# Altium schematic symbol library jlcpcb_2025_04_capacitors_extended_0805.schlib: 3281 symbols (part 18 of 18) (continued)
## TMK212BBJ106KGHT
designator C?  Capacitance: 10uF  (hidden comment: *)
Capacitor, Ceramic (MLCC), 10uF, ±10%, 25V, X5R, ±10%, SMD 0805; Manufacturer: Taiyo Yuden; Manufacturer Part Number: TMK212BBJ106KGHT; Package Size: 0805; JLCPCB Basic Part: No; JLCPCB Part Number: C386084; Supplier 1: LCSC; Category: Capacitors - MLCC; Supplier Part Number 1: C386084; Tolerance: ±10%; Voltage Rating: 25V; Temperature Coefficient: X5R; RoHS: Yes; ComponentLink1Description: Datasheet; ComponentLink1URL: https://wmsc.lcsc.com/wmsc/upload/file/pdf/v2/lcsc/2304140030_Taiyo-Yuden-TMK212BBJ106KGHT_C386084.pdf; ComponentLink2Description: JLCPCB Part URL; ComponentLink2URL: https://jlcpcb.com/partdetail/C386084; ComponentLink3Description: LCSC Part URL; ComponentLink3URL: https://lcsc.com/product-detail/Multilayer-Ceramic-Capacitors-MLCC---SMD-SMT_Taiyo-Yuden-Taiyo-Yuden-TMK212BBJ106KGHT_C386084.html
footprint CAP-0805 (0805 (2012M) Capacitor)
pins: 1, 2

## TMK212BBJ106MG-T
designator C?  Capacitance: 10uF  (hidden comment: *)
Capacitor, Ceramic (MLCC), 10uF, ±20%, 25V, X5R, ±20%, SMD 0805; Manufacturer: Taiyo Yuden; Manufacturer Part Number: TMK212BBJ106MG-T; Package Size: 0805; JLCPCB Basic Part: No; JLCPCB Part Number: C92606; Supplier 1: LCSC; Category: Capacitors - MLCC; Supplier Part Number 1: C92606; Tolerance: ±20%; Voltage Rating: 25V; Temperature Coefficient: X5R; RoHS: Yes; ComponentLink1Description: Datasheet; ComponentLink1URL: https://wmsc.lcsc.com/wmsc/upload/file/pdf/v2/lcsc/1810091433_Taiyo-Yuden-TMK212BBJ106MG-T_C92606.pdf; ComponentLink2Description: JLCPCB Part URL; ComponentLink2URL: https://jlcpcb.com/partdetail/C92606; ComponentLink3Description: LCSC Part URL; ComponentLink3URL: https://lcsc.com/product-detail/Multilayer-Ceramic-Capacitors-MLCC---SMD-SMT_Taiyo-Yuden-Taiyo-Yuden-TMK212BBJ106MG-T_C92606.html
footprint CAP-0805 (0805 (2012M) Capacitor)
pins: 1, 2

## TMK212BBJ226MG-TT
designator C?  Capacitance: 22uF  (hidden comment: *)
Capacitor, Ceramic (MLCC), 22uF, ±20%, 25V, X5R, ±20%, SMD 0805; Manufacturer: Taiyo Yuden; Manufacturer Part Number: TMK212BBJ226MG-TT; Package Size: 0805; JLCPCB Basic Part: No; JLCPCB Part Number: C2686248; Supplier 1: LCSC; Category: Capacitors - MLCC; Supplier Part Number 1: C2686248; Tolerance: ±20%; Voltage Rating: 25V; Temperature Coefficient: X5R; RoHS: Yes; ComponentLink1Description: Datasheet; ComponentLink1URL: https://wmsc.lcsc.com/wmsc/upload/file/pdf/v2/lcsc/2106070205_Taiyo-Yuden-TMK212BBJ226MG-TT_C2686248.pdf; ComponentLink2Description: JLCPCB Part URL; ComponentLink2URL: https://jlcpcb.com/partdetail/C2686248; ComponentLink3Description: LCSC Part URL; ComponentLink3URL: https://lcsc.com/product-detail/Multilayer-Ceramic-Capacitors-MLCC---SMD-SMT_Taiyo-Yuden-Taiyo-Yuden-TMK212BBJ226MG-TT_C2686248.html
footprint CAP-0805 (0805 (2012M) Capacitor)
pins: 1, 2

## TMK212BBJ475KGHT
designator C?  Capacitance: 4.7uF  (hidden comment: *)
Capacitor, Ceramic (MLCC), 4.7uF, ±10%, 25V, X5R, ±10%, SMD 0805; Manufacturer: Taiyo Yuden; Manufacturer Part Number: TMK212BBJ475KGHT; Package Size: 0805; JLCPCB Basic Part: No; JLCPCB Part Number: C386086; Supplier 1: LCSC; Category: Capacitors - MLCC; Supplier Part Number 1: C386086; Tolerance: ±10%; Voltage Rating: 25V; Temperature Coefficient: X5R; RoHS: Yes; ComponentLink1Description: Datasheet; ComponentLink1URL: https://wmsc.lcsc.com/wmsc/upload/file/pdf/v2/lcsc/2211282230_Taiyo-Yuden-TMK212BBJ475KGHT_C386086.pdf; ComponentLink2Description: JLCPCB Part URL; ComponentLink2URL: https://jlcpcb.com/partdetail/C386086; ComponentLink3Description: LCSC Part URL; ComponentLink3URL: https://lcsc.com/product-detail/Multilayer-Ceramic-Capacitors-MLCC---SMD-SMT_Taiyo-Yuden-Taiyo-Yuden-TMK212BBJ475KGHT_C386086.html
footprint CAP-0805 (0805 (2012M) Capacitor)
pins: 1, 2

## TMK212BBJ475MD-T
designator C?  Capacitance: 4.7uF  (hidden comment: *)
Capacitor, Ceramic (MLCC), 4.7uF, ±20%, 25V, X5R, ±20%, SMD 0805; Manufacturer: Taiyo Yuden; Manufacturer Part Number: TMK212BBJ475MD-T; Package Size: 0805; JLCPCB Basic Part: No; JLCPCB Part Number: C650989; Supplier 1: LCSC; Category: Capacitors - MLCC; Supplier Part Number 1: C650989; Tolerance: ±20%; Voltage Rating: 25V; Temperature Coefficient: X5R; RoHS: Yes; ComponentLink1Description: Datasheet; ComponentLink1URL: https://wmsc.lcsc.com/wmsc/upload/file/pdf/v2/lcsc/2211282200_Taiyo-Yuden-TMK212BBJ475MD-T_C650989.pdf; ComponentLink2Description: JLCPCB Part URL; ComponentLink2URL: https://jlcpcb.com/partdetail/C650989; ComponentLink3Description: LCSC Part URL; ComponentLink3URL: https://lcsc.com/product-detail/Multilayer-Ceramic-Capacitors-MLCC---SMD-SMT_Taiyo-Yuden-Taiyo-Yuden-TMK212BBJ475MD-T_C650989.html
footprint CAP-0805 (0805 (2012M) Capacitor)
pins: 1, 2

## TMK212BJ105KD-T
designator C?  Capacitance: 1uF  (hidden comment: *)
Capacitor, Ceramic (MLCC), 1uF, ±10%, 25V, X5R, ±10%, SMD 0805; Manufacturer: Taiyo Yuden; Manufacturer Part Number: TMK212BJ105KD-T; Package Size: 0805; JLCPCB Basic Part: No; JLCPCB Part Number: C2174205; Supplier 1: LCSC; Category: Capacitors - MLCC; Supplier Part Number 1: C2174205; Tolerance: ±10%; Voltage Rating: 25V; Temperature Coefficient: X5R; RoHS: Yes; ComponentLink1Description: Datasheet; ComponentLink1URL: https://wmsc.lcsc.com/wmsc/upload/file/pdf/v2/lcsc/2211282000_Taiyo-Yuden-TMK212BJ105KD-T_C2174205.pdf; ComponentLink2Description: JLCPCB Part URL; ComponentLink2URL: https://jlcpcb.com/partdetail/C2174205; ComponentLink3Description: LCSC Part URL; ComponentLink3URL: https://lcsc.com/product-detail/Multilayer-Ceramic-Capacitors-MLCC---SMD-SMT_Taiyo-Yuden-Taiyo-Yuden-TMK212BJ105KD-T_C2174205.html
footprint CAP-0805 (0805 (2012M) Capacitor)
pins: 1, 2

## TMK212BJ105KG-T
designator C?  Capacitance: 1uF  (hidden comment: *)
Capacitor, Ceramic (MLCC), 1uF, ±10%, 25V, X5R, ±10%, SMD 0805; Manufacturer: Taiyo Yuden; Manufacturer Part Number: TMK212BJ105KG-T; Package Size: 0805; JLCPCB Basic Part: No; JLCPCB Part Number: C92829; Supplier 1: LCSC; Category: Capacitors - MLCC; Supplier Part Number 1: C92829; Tolerance: ±10%; Voltage Rating: 25V; Temperature Coefficient: X5R; RoHS: Yes; ComponentLink1Description: Datasheet; ComponentLink1URL: https://wmsc.lcsc.com/wmsc/upload/file/pdf/v2/lcsc/2211282300_Taiyo-Yuden-TMK212BJ105KG-T_C92829.pdf; ComponentLink2Description: JLCPCB Part URL; ComponentLink2URL: https://jlcpcb.com/partdetail/C92829; ComponentLink3Description: LCSC Part URL; ComponentLink3URL: https://lcsc.com/product-detail/Multilayer-Ceramic-Capacitors-MLCC---SMD-SMT_Taiyo-Yuden-Taiyo-Yuden-TMK212BJ105KG-T_C92829.html
footprint CAP-0805 (0805 (2012M) Capacitor)
pins: 1, 2

## TMK212BJ106KG-TD
designator C?  Capacitance: 10uF  (hidden comment: *)
Capacitor, Ceramic (MLCC), 10uF, ±10%, 25V, ±10%, SMD 0805; Manufacturer: Taiyo Yuden; Manufacturer Part Number: TMK212BJ106KG-TD; Package Size: 0805; JLCPCB Basic Part: No; JLCPCB Part Number: C386087; Supplier 1: LCSC; Category: Capacitors - MLCC; Supplier Part Number 1: C386087; Tolerance: ±10%; Voltage Rating: 25V; RoHS: Yes; ComponentLink1Description: Datasheet; ComponentLink1URL: https://wmsc.lcsc.com/wmsc/upload/file/pdf/v2/lcsc/2304140030_Taiyo-Yuden-TMK212BJ106KG-TD_C386087.pdf; ComponentLink2Description: JLCPCB Part URL; ComponentLink2URL: https://jlcpcb.com/partdetail/C386087; ComponentLink3Description: LCSC Part URL; ComponentLink3URL: https://lcsc.com/product-detail/Multilayer-Ceramic-Capacitors-MLCC---SMD-SMT_Taiyo-Yuden-Taiyo-Yuden-TMK212BJ106KG-TD_C386087.html
footprint CAP-0805 (0805 (2012M) Capacitor)
pins: 1, 2

## TMK212BJ225KG-T
designator C?  Capacitance: 2.2uF  (hidden comment: *)
Capacitor, Ceramic (MLCC), 2.2uF, ±10%, 25V, X5R, ±10%, SMD 0805; Manufacturer: Taiyo Yuden; Manufacturer Part Number: TMK212BJ225KG-T; Package Size: 0805; JLCPCB Basic Part: No; JLCPCB Part Number: C92830; Supplier 1: LCSC; Category: Capacitors - MLCC; Supplier Part Number 1: C92830; Tolerance: ±10%; Voltage Rating: 25V; Temperature Coefficient: X5R; RoHS: Yes; ComponentLink1Description: Datasheet; ComponentLink1URL: https://wmsc.lcsc.com/wmsc/upload/file/pdf/v2/lcsc/1810182213_Taiyo-Yuden-TMK212BJ225KG-T_C92830.pdf; ComponentLink2Description: JLCPCB Part URL; ComponentLink2URL: https://jlcpcb.com/partdetail/C92830; ComponentLink3Description: LCSC Part URL; ComponentLink3URL: https://lcsc.com/product-detail/Multilayer-Ceramic-Capacitors-MLCC---SMD-SMT_Taiyo-Yuden-Taiyo-Yuden-TMK212BJ225KG-T_C92830.html
footprint CAP-0805 (0805 (2012M) Capacitor)
pins: 1, 2

## TMK212BJ474KD-T
designator C?  Capacitance: 470nF  (hidden comment: *)
Capacitor, Ceramic (MLCC), 470nF, ±10%, 25V, X5R, ±10%, SMD 0805; Manufacturer: Taiyo Yuden; Manufacturer Part Number: TMK212BJ474KD-T; Package Size: 0805; JLCPCB Basic Part: No; JLCPCB Part Number: C386088; Supplier 1: LCSC; Category: Capacitors - MLCC; Supplier Part Number 1: C386088; Tolerance: ±10%; Voltage Rating: 25V; Temperature Coefficient: X5R; RoHS: Yes; ComponentLink1Description: Datasheet; ComponentLink1URL: https://wmsc.lcsc.com/wmsc/upload/file/pdf/v2/lcsc/2211282230_Taiyo-Yuden-TMK212BJ474KD-T_C386088.pdf; ComponentLink2Description: JLCPCB Part URL; ComponentLink2URL: https://jlcpcb.com/partdetail/C386088; ComponentLink3Description: LCSC Part URL; ComponentLink3URL: https://lcsc.com/product-detail/Multilayer-Ceramic-Capacitors-MLCC---SMD-SMT_Taiyo-Yuden-Taiyo-Yuden-TMK212BJ474KD-T_C386088.html
footprint CAP-0805 (0805 (2012M) Capacitor)
pins: 1, 2

## TMK212BJ475KG-T
designator C?  Capacitance: 4.7uF  (hidden comment: *)
Capacitor, Ceramic (MLCC), 4.7uF, ±10%, 25V, X5R, ±10%, SMD 0805; Manufacturer: Taiyo Yuden; Manufacturer Part Number: TMK212BJ475KG-T; Package Size: 0805; JLCPCB Basic Part: No; JLCPCB Part Number: C319192; Supplier 1: LCSC; Category: Capacitors - MLCC; Supplier Part Number 1: C319192; Tolerance: ±10%; Voltage Rating: 25V; Temperature Coefficient: X5R; RoHS: Yes; ComponentLink1Description: Datasheet; ComponentLink1URL: https://wmsc.lcsc.com/wmsc/upload/file/pdf/v2/lcsc/2304140030_Taiyo-Yuden-TMK212BJ475KG-T_C319192.pdf; ComponentLink2Description: JLCPCB Part URL; ComponentLink2URL: https://jlcpcb.com/partdetail/C319192; ComponentLink3Description: LCSC Part URL; ComponentLink3URL: https://lcsc.com/product-detail/Multilayer-Ceramic-Capacitors-MLCC---SMD-SMT_Taiyo-Yuden-Taiyo-Yuden-TMK212BJ475KG-T_C319192.html
footprint CAP-0805 (0805 (2012M) Capacitor)
pins: 1, 2

## TT21X475K160CT
designator C?  Capacitance: 4.7uF  (hidden comment: *)
Capacitor, Ceramic (MLCC), 4.7uF, ±10%, 16V, X5R, ±10%, SMD 0805; Manufacturer: Walsin Tech Corp; Manufacturer Part Number: TT21X475K160CT; Package Size: 0805; JLCPCB Basic Part: No; JLCPCB Part Number: C384657; Supplier 1: LCSC; Category: Capacitors - MLCC; Supplier Part Number 1: C384657; Tolerance: ±10%; Voltage Rating: 16V; Temperature Coefficient: X5R; RoHS: Yes; ComponentLink1Description: Datasheet; ComponentLink1URL: https://wmsc.lcsc.com/wmsc/upload/file/pdf/v2/lcsc/1912111437_Walsin-Tech-Corp-TT21X475K160CT_C384657.pdf; ComponentLink2Description: JLCPCB Part URL; ComponentLink2URL: https://jlcpcb.com/partdetail/C384657; ComponentLink3Description: LCSC Part URL; ComponentLink3URL: https://lcsc.com/product-detail/Multilayer-Ceramic-Capacitors-MLCC---SMD-SMT_Walsin-Tech-Corp-Walsin-Tech-Corp-TT21X475K160CT_C384657.html
footprint CAP-0805 (0805 (2012M) Capacitor)
pins: 1, 2

## UMF212B7105KGHT
designator C?  Capacitance: 1uF  (hidden comment: *)
Capacitor, Ceramic (MLCC), 1uF, ±10%, 50V, ±10%, SMD 0805; Manufacturer: Taiyo Yuden; Manufacturer Part Number: UMF212B7105KGHT; Package Size: 0805; JLCPCB Basic Part: No; JLCPCB Part Number: C386107; Supplier 1: LCSC; Category: Capacitors - MLCC; Supplier Part Number 1: C386107; Tolerance: ±10%; Voltage Rating: 50V; RoHS: Yes; ComponentLink1Description: Datasheet; ComponentLink1URL: https://wmsc.lcsc.com/wmsc/upload/file/pdf/v2/lcsc/2010231635_Taiyo-Yuden-UMF212B7105KGHT_C386107.pdf; ComponentLink2Description: JLCPCB Part URL; ComponentLink2URL: https://jlcpcb.com/partdetail/C386107; ComponentLink3Description: LCSC Part URL; ComponentLink3URL: https://lcsc.com/product-detail/Multilayer-Ceramic-Capacitors-MLCC---SMD-SMT_Taiyo-Yuden-Taiyo-Yuden-UMF212B7105KGHT_C386107.html
footprint CAP-0805 (0805 (2012M) Capacitor)
pins: 1, 2

## UMF212B7224KGHT
designator C?  Capacitance: 220nF  (hidden comment: *)
Capacitor, Ceramic (MLCC), 220nF, ±10%, 50V, X7R, ±10%, SMD 0805; Manufacturer: Taiyo Yuden; Manufacturer Part Number: UMF212B7224KGHT; Package Size: 0805; JLCPCB Basic Part: No; JLCPCB Part Number: C651009; Supplier 1: LCSC; Category: Capacitors - MLCC; Supplier Part Number 1: C651009; Tolerance: ±10%; Voltage Rating: 50V; Temperature Coefficient: X7R; RoHS: Yes; ComponentLink1Description: Datasheet; ComponentLink1URL: https://wmsc.lcsc.com/wmsc/upload/file/pdf/v2/lcsc/2304140030_Taiyo-Yuden-UMF212B7224KGHT_C651009.pdf; ComponentLink2Description: JLCPCB Part URL; ComponentLink2URL: https://jlcpcb.com/partdetail/C651009; ComponentLink3Description: LCSC Part URL; ComponentLink3URL: https://lcsc.com/product-detail/Multilayer-Ceramic-Capacitors-MLCC---SMD-SMT_Taiyo-Yuden-Taiyo-Yuden-UMF212B7224KGHT_C651009.html
footprint CAP-0805 (0805 (2012M) Capacitor)
pins: 1, 2

## UMJ212BB7103KGHT
designator C?  Capacitance: 10nF  (hidden comment: *)
Capacitor, Ceramic (MLCC), 10nF, ±10%, 50V, X7R, ±10%, SMD 0805; Manufacturer: Taiyo Yuden; Manufacturer Part Number: UMJ212BB7103KGHT; Package Size: 0805; JLCPCB Basic Part: No; JLCPCB Part Number: C651019; Supplier 1: LCSC; Category: Capacitors - MLCC; Supplier Part Number 1: C651019; Tolerance: ±10%; Voltage Rating: 50V; Temperature Coefficient: X7R; RoHS: Yes; ComponentLink1Description: Datasheet; ComponentLink1URL: https://wmsc.lcsc.com/wmsc/upload/file/pdf/v2/lcsc/2304140030_Taiyo-Yuden-UMJ212BB7103KGHT_C651019.pdf; ComponentLink2Description: JLCPCB Part URL; ComponentLink2URL: https://jlcpcb.com/partdetail/C651019; ComponentLink3Description: LCSC Part URL; ComponentLink3URL: https://lcsc.com/product-detail/Multilayer-Ceramic-Capacitors-MLCC---SMD-SMT_Taiyo-Yuden-Taiyo-Yuden-UMJ212BB7103KGHT_C651019.html
footprint CAP-0805 (0805 (2012M) Capacitor)
pins: 1, 2

## UMJ212BB7104KGHT
designator C?  Capacitance: 100nF  (hidden comment: *)
Capacitor, Ceramic (MLCC), 100nF, ±10%, 50V, X7R, ±10%, SMD 0805; Manufacturer: Taiyo Yuden; Manufacturer Part Number: UMJ212BB7104KGHT; Package Size: 0805; JLCPCB Basic Part: No; JLCPCB Part Number: C651000; Supplier 1: LCSC; Category: Capacitors - MLCC; Supplier Part Number 1: C651000; Tolerance: ±10%; Voltage Rating: 50V; Temperature Coefficient: X7R; RoHS: Yes; ComponentLink1Description: Datasheet; ComponentLink1URL: https://wmsc.lcsc.com/wmsc/upload/file/pdf/v2/lcsc/2304140030_Taiyo-Yuden-UMJ212BB7104KGHT_C651000.pdf; ComponentLink2Description: JLCPCB Part URL; ComponentLink2URL: https://jlcpcb.com/partdetail/C651000; ComponentLink3Description: LCSC Part URL; ComponentLink3URL: https://lcsc.com/product-detail/Multilayer-Ceramic-Capacitors-MLCC---SMD-SMT_Taiyo-Yuden-Taiyo-Yuden-UMJ212BB7104KGHT_C651000.html
footprint CAP-0805 (0805 (2012M) Capacitor)
pins: 1, 2

## UMJ212BB7223KGHT
designator C?  Capacitance: 22nF  (hidden comment: *)
Capacitor, Ceramic (MLCC), 22nF, ±10%, 50V, X7R, ±10%, SMD 0805; Manufacturer: Taiyo Yuden; Manufacturer Part Number: UMJ212BB7223KGHT; Package Size: 0805; JLCPCB Basic Part: No; JLCPCB Part Number: C651014; Supplier 1: LCSC; Category: Capacitors - MLCC; Supplier Part Number 1: C651014; Tolerance: ±10%; Voltage Rating: 50V; Temperature Coefficient: X7R; RoHS: Yes; ComponentLink1Description: Datasheet; ComponentLink1URL: https://wmsc.lcsc.com/wmsc/upload/file/pdf/v2/lcsc/2304140030_Taiyo-Yuden-UMJ212BB7223KGHT_C651014.pdf; ComponentLink2Description: JLCPCB Part URL; ComponentLink2URL: https://jlcpcb.com/partdetail/C651014; ComponentLink3Description: LCSC Part URL; ComponentLink3URL: https://lcsc.com/product-detail/Multilayer-Ceramic-Capacitors-MLCC---SMD-SMT_Taiyo-Yuden-Taiyo-Yuden-UMJ212BB7223KGHT_C651014.html
footprint CAP-0805 (0805 (2012M) Capacitor)
pins: 1, 2

## UMJ212BB7473KGHT
designator C?  Capacitance: 47nF  (hidden comment: *)
Capacitor, Ceramic (MLCC), 47nF, ±10%, 50V, X7R, ±10%, SMD 0805; Manufacturer: Taiyo Yuden; Manufacturer Part Number: UMJ212BB7473KGHT; Package Size: 0805; JLCPCB Basic Part: No; JLCPCB Part Number: C651020; Supplier 1: LCSC; Category: Capacitors - MLCC; Supplier Part Number 1: C651020; Tolerance: ±10%; Voltage Rating: 50V; Temperature Coefficient: X7R; RoHS: Yes; ComponentLink1Description: Datasheet; ComponentLink1URL: https://wmsc.lcsc.com/wmsc/upload/file/pdf/v2/lcsc/2304140030_Taiyo-Yuden-UMJ212BB7473KGHT_C651020.pdf; ComponentLink2Description: JLCPCB Part URL; ComponentLink2URL: https://jlcpcb.com/partdetail/C651020; ComponentLink3Description: LCSC Part URL; ComponentLink3URL: https://lcsc.com/product-detail/Multilayer-Ceramic-Capacitors-MLCC---SMD-SMT_Taiyo-Yuden-Taiyo-Yuden-UMJ212BB7473KGHT_C651020.html
footprint CAP-0805 (0805 (2012M) Capacitor)
pins: 1, 2

## UMJ212CB7105KGHT
designator C?  Capacitance: 1uF  (hidden comment: *)
Capacitor, Ceramic (MLCC), 1uF, ±10%, 50V, X7R, ±10%, SMD 0805; Manufacturer: Taiyo Yuden; Manufacturer Part Number: UMJ212CB7105KGHT; Package Size: 0805; JLCPCB Basic Part: No; JLCPCB Part Number: C2181287; Supplier 1: LCSC; Category: Capacitors - MLCC; Supplier Part Number 1: C2181287; Tolerance: ±10%; Voltage Rating: 50V; Temperature Coefficient: X7R; RoHS: Yes; ComponentLink1Description: Datasheet; ComponentLink1URL: https://wmsc.lcsc.com/wmsc/upload/file/pdf/v2/lcsc/2211282000_Taiyo-Yuden-UMJ212CB7105KGHT_C2181287.pdf; ComponentLink2Description: JLCPCB Part URL; ComponentLink2URL: https://jlcpcb.com/partdetail/C2181287; ComponentLink3Description: LCSC Part URL; ComponentLink3URL: https://lcsc.com/product-detail/Multilayer-Ceramic-Capacitors-MLCC---SMD-SMT_Taiyo-Yuden-Taiyo-Yuden-UMJ212CB7105KGHT_C2181287.html
footprint CAP-0805 (0805 (2012M) Capacitor)
pins: 1, 2

## UMK212ABJ225KG-T
designator C?  Capacitance: 2.2uF  (hidden comment: *)
Capacitor, Ceramic (MLCC), 2.2uF, ±10%, 50V, X5R, ±10%, SMD 0805; Manufacturer: Taiyo Yuden; Manufacturer Part Number: UMK212ABJ225KG-T; Package Size: 0805; JLCPCB Basic Part: No; JLCPCB Part Number: C337444; Supplier 1: LCSC; Category: Capacitors - MLCC; Supplier Part Number 1: C337444; Tolerance: ±10%; Voltage Rating: 50V; Temperature Coefficient: X5R; RoHS: Yes; ComponentLink1Description: Datasheet; ComponentLink1URL: https://wmsc.lcsc.com/wmsc/upload/file/pdf/v2/lcsc/2211282230_Taiyo-Yuden-UMK212ABJ225KG-T_C337444.pdf; ComponentLink2Description: JLCPCB Part URL; ComponentLink2URL: https://jlcpcb.com/partdetail/C337444; ComponentLink3Description: LCSC Part URL; ComponentLink3URL: https://lcsc.com/product-detail/Multilayer-Ceramic-Capacitors-MLCC---SMD-SMT_Taiyo-Yuden-Taiyo-Yuden-UMK212ABJ225KG-T_C337444.html
footprint CAP-0805 (0805 (2012M) Capacitor)
pins: 1, 2

## UMK212B7103KGHT
designator C?  Capacitance: 10nF  (hidden comment: *)
Capacitor, Ceramic (MLCC), 10nF, ±10%, 50V, X7R, ±10%, SMD 0805; Manufacturer: Taiyo Yuden; Manufacturer Part Number: UMK212B7103KGHT; Package Size: 0805; JLCPCB Basic Part: No; JLCPCB Part Number: C650940; Supplier 1: LCSC; Category: Capacitors - MLCC; Supplier Part Number 1: C650940; Tolerance: ±10%; Voltage Rating: 50V; Temperature Coefficient: X7R; RoHS: Yes; ComponentLink1Description: Datasheet; ComponentLink1URL: https://wmsc.lcsc.com/wmsc/upload/file/pdf/v2/lcsc/2304140030_Taiyo-Yuden-UMK212B7103KGHT_C650940.pdf; ComponentLink2Description: JLCPCB Part URL; ComponentLink2URL: https://jlcpcb.com/partdetail/C650940; ComponentLink3Description: LCSC Part URL; ComponentLink3URL: https://lcsc.com/product-detail/Multilayer-Ceramic-Capacitors-MLCC---SMD-SMT_Taiyo-Yuden-Taiyo-Yuden-UMK212B7103KGHT_C650940.html
footprint CAP-0805 (0805 (2012M) Capacitor)
pins: 1, 2

## UMK212B7104KGHT
designator C?  Capacitance: 100nF  (hidden comment: *)
Capacitor, Ceramic (MLCC), 100nF, ±10%, 50V, X7R, ±10%, SMD 0805; Manufacturer: Taiyo Yuden; Manufacturer Part Number: UMK212B7104KGHT; Package Size: 0805; JLCPCB Basic Part: No; JLCPCB Part Number: C268015; Supplier 1: LCSC; Category: Capacitors - MLCC; Supplier Part Number 1: C268015; Tolerance: ±10%; Voltage Rating: 50V; Temperature Coefficient: X7R; RoHS: Yes; ComponentLink1Description: Datasheet; ComponentLink1URL: https://wmsc.lcsc.com/wmsc/upload/file/pdf/v2/lcsc/2211282230_Taiyo-Yuden-UMK212B7104KGHT_C268015.pdf; ComponentLink2Description: JLCPCB Part URL; ComponentLink2URL: https://jlcpcb.com/partdetail/C268015; ComponentLink3Description: LCSC Part URL; ComponentLink3URL: https://lcsc.com/product-detail/Multilayer-Ceramic-Capacitors-MLCC---SMD-SMT_Taiyo-Yuden-Taiyo-Yuden-UMK212B7104KGHT_C268015.html
footprint CAP-0805 (0805 (2012M) Capacitor)
pins: 1, 2

## UMK212B7105KG-T
designator C?  Capacitance: 1uF  (hidden comment: *)
Capacitor, Ceramic (MLCC), 1uF, ±10%, 50V, X7R, ±10%, SMD 0805; Manufacturer: Taiyo Yuden; Manufacturer Part Number: UMK212B7105KG-T; Package Size: 0805; JLCPCB Basic Part: No; JLCPCB Part Number: C92850; Supplier 1: LCSC; Category: Capacitors - MLCC; Supplier Part Number 1: C92850; Tolerance: ±10%; Voltage Rating: 50V; Temperature Coefficient: X7R; RoHS: Yes; ComponentLink1Description: Datasheet; ComponentLink1URL: https://wmsc.lcsc.com/wmsc/upload/file/pdf/v2/lcsc/2211282300_Taiyo-Yuden-UMK212B7105KG-T_C92850.pdf; ComponentLink2Description: JLCPCB Part URL; ComponentLink2URL: https://jlcpcb.com/partdetail/C92850; ComponentLink3Description: LCSC Part URL; ComponentLink3URL: https://lcsc.com/product-detail/Multilayer-Ceramic-Capacitors-MLCC---SMD-SMT_Taiyo-Yuden-Taiyo-Yuden-UMK212B7105KG-T_C92850.html
footprint CAP-0805 (0805 (2012M) Capacitor)
pins: 1, 2

## UMK212B7105KGHT
designator C?  Capacitance: 1uF  (hidden comment: *)
Capacitor, Ceramic (MLCC), 1uF, ±10%, 50V, ±10%, SMD 0805; Manufacturer: Taiyo Yuden; Manufacturer Part Number: UMK212B7105KGHT; Package Size: 0805; JLCPCB Basic Part: No; JLCPCB Part Number: C386160; Supplier 1: LCSC; Category: Capacitors - MLCC; Supplier Part Number 1: C386160; Tolerance: ±10%; Voltage Rating: 50V; RoHS: Yes; ComponentLink1Description: Datasheet; ComponentLink1URL: https://wmsc.lcsc.com/wmsc/upload/file/pdf/v2/lcsc/2211282230_Taiyo-Yuden-UMK212B7105KGHT_C386160.pdf; ComponentLink2Description: JLCPCB Part URL; ComponentLink2URL: https://jlcpcb.com/partdetail/C386160; ComponentLink3Description: LCSC Part URL; ComponentLink3URL: https://lcsc.com/product-detail/Multilayer-Ceramic-Capacitors-MLCC---SMD-SMT_Taiyo-Yuden-Taiyo-Yuden-UMK212B7105KGHT_C386160.html
footprint CAP-0805 (0805 (2012M) Capacitor)
pins: 1, 2

## UMK212B7224KG-T
designator C?  Capacitance: 220nF  (hidden comment: *)
Capacitor, Ceramic (MLCC), 220nF, ±10%, 50V, X7R, ±10%, SMD 0805; Manufacturer: Taiyo Yuden; Manufacturer Part Number: UMK212B7224KG-T; Package Size: 0805; JLCPCB Basic Part: No; JLCPCB Part Number: C412633; Supplier 1: LCSC; Category: Capacitors - MLCC; Supplier Part Number 1: C412633; Tolerance: ±10%; Voltage Rating: 50V; Temperature Coefficient: X7R; RoHS: Yes; ComponentLink1Description: Datasheet; ComponentLink1URL: https://wmsc.lcsc.com/wmsc/upload/file/pdf/v2/lcsc/2211282230_Taiyo-Yuden-UMK212B7224KG-T_C412633.pdf; ComponentLink2Description: JLCPCB Part URL; ComponentLink2URL: https://jlcpcb.com/partdetail/C412633; ComponentLink3Description: LCSC Part URL; ComponentLink3URL: https://lcsc.com/product-detail/Multilayer-Ceramic-Capacitors-MLCC---SMD-SMT_Taiyo-Yuden-Taiyo-Yuden-UMK212B7224KG-T_C412633.html
footprint CAP-0805 (0805 (2012M) Capacitor)
pins: 1, 2

## UMK212B7224KGHT
designator C?  Capacitance: 220nF  (hidden comment: *)
Capacitor, Ceramic (MLCC), 220nF, ±10%, 50V, X7R, ±10%, SMD 0805; Manufacturer: Taiyo Yuden; Manufacturer Part Number: UMK212B7224KGHT; Package Size: 0805; JLCPCB Basic Part: No; JLCPCB Part Number: C650962; Supplier 1: LCSC; Category: Capacitors - MLCC; Supplier Part Number 1: C650962; Tolerance: ±10%; Voltage Rating: 50V; Temperature Coefficient: X7R; RoHS: Yes; ComponentLink1Description: Datasheet; ComponentLink1URL: https://wmsc.lcsc.com/wmsc/upload/file/pdf/v2/lcsc/2211282200_Taiyo-Yuden-UMK212B7224KGHT_C650962.pdf; ComponentLink2Description: JLCPCB Part URL; ComponentLink2URL: https://jlcpcb.com/partdetail/C650962; ComponentLink3Description: LCSC Part URL; ComponentLink3URL: https://lcsc.com/product-detail/Multilayer-Ceramic-Capacitors-MLCC---SMD-SMT_Taiyo-Yuden-Taiyo-Yuden-UMK212B7224KGHT_C650962.html
footprint CAP-0805 (0805 (2012M) Capacitor)
pins: 1, 2

## UMK212B7473KGHT
designator C?  Capacitance: 47nF  (hidden comment: *)
Capacitor, Ceramic (MLCC), 47nF, ±10%, 50V, X7R, ±10%, SMD 0805; Manufacturer: Taiyo Yuden; Manufacturer Part Number: UMK212B7473KGHT; Package Size: 0805; JLCPCB Basic Part: No; JLCPCB Part Number: C650972; Supplier 1: LCSC; Category: Capacitors - MLCC; Supplier Part Number 1: C650972; Tolerance: ±10%; Voltage Rating: 50V; Temperature Coefficient: X7R; RoHS: Yes; ComponentLink1Description: Datasheet; ComponentLink1URL: https://wmsc.lcsc.com/wmsc/upload/file/pdf/v2/lcsc/2211282200_Taiyo-Yuden-UMK212B7473KGHT_C650972.pdf; ComponentLink2Description: JLCPCB Part URL; ComponentLink2URL: https://jlcpcb.com/partdetail/C650972; ComponentLink3Description: LCSC Part URL; ComponentLink3URL: https://lcsc.com/product-detail/Multilayer-Ceramic-Capacitors-MLCC---SMD-SMT_Taiyo-Yuden-Taiyo-Yuden-UMK212B7473KGHT_C650972.html
footprint CAP-0805 (0805 (2012M) Capacitor)
pins: 1, 2

## UMK212B7683KGHT
designator C?  Capacitance: 68nF  (hidden comment: *)
Capacitor, Ceramic (MLCC), 68nF, ±10%, 50V, X7R, ±10%, SMD 0805; Manufacturer: Taiyo Yuden; Manufacturer Part Number: UMK212B7683KGHT; Package Size: 0805; JLCPCB Basic Part: No; JLCPCB Part Number: C650955; Supplier 1: LCSC; Category: Capacitors - MLCC; Supplier Part Number 1: C650955; Tolerance: ±10%; Voltage Rating: 50V; Temperature Coefficient: X7R; RoHS: Yes; ComponentLink1Description: Datasheet; ComponentLink1URL: https://wmsc.lcsc.com/wmsc/upload/file/pdf/v2/lcsc/2304140030_Taiyo-Yuden-UMK212B7683KGHT_C650955.pdf; ComponentLink2Description: JLCPCB Part URL; ComponentLink2URL: https://jlcpcb.com/partdetail/C650955; ComponentLink3Description: LCSC Part URL; ComponentLink3URL: https://lcsc.com/product-detail/Multilayer-Ceramic-Capacitors-MLCC---SMD-SMT_Taiyo-Yuden-Taiyo-Yuden-UMK212B7683KGHT_C650955.html
footprint CAP-0805 (0805 (2012M) Capacitor)
pins: 1, 2

## UMK212BB7225KG-T
designator C?  Capacitance: 2.2uF  (hidden comment: *)
Capacitor, Ceramic (MLCC), 2.2uF, ±10%, 50V, X7R, ±10%, SMD 0805; Manufacturer: Taiyo Yuden; Manufacturer Part Number: UMK212BB7225KG-T; Package Size: 0805; JLCPCB Basic Part: No; JLCPCB Part Number: C348735; Supplier 1: LCSC; Category: Capacitors - MLCC; Supplier Part Number 1: C348735; Tolerance: ±10%; Voltage Rating: 50V; Temperature Coefficient: X7R; RoHS: Yes; ComponentLink1Description: Datasheet; ComponentLink1URL: https://wmsc.lcsc.com/wmsc/upload/file/pdf/v2/lcsc/2404191548_Taiyo-Yuden-UMK212BB7225KG-T_C348735.pdf; ComponentLink2Description: JLCPCB Part URL; ComponentLink2URL: https://jlcpcb.com/partdetail/C348735; ComponentLink3Description: LCSC Part URL; ComponentLink3URL: https://lcsc.com/product-detail/Multilayer-Ceramic-Capacitors-MLCC---SMD-SMT_Taiyo-Yuden-Taiyo-Yuden-UMK212BB7225KG-T_C348735.html
footprint CAP-0805 (0805 (2012M) Capacitor)
pins: 1, 2

## UMK212BBJ475KG-T
designator C?  Capacitance: 4.7uF  (hidden comment: *)
Capacitor, Ceramic (MLCC), 4.7uF, ±10%, 50V, X5R, ±10%, SMD 0805; Manufacturer: Taiyo Yuden; Manufacturer Part Number: UMK212BBJ475KG-T; Package Size: 0805; JLCPCB Basic Part: No; JLCPCB Part Number: C412634; Supplier 1: LCSC; Category: Capacitors - MLCC; Supplier Part Number 1: C412634; Tolerance: ±10%; Voltage Rating: 50V; Temperature Coefficient: X5R; RoHS: Yes; ComponentLink1Description: Datasheet; ComponentLink1URL: https://wmsc.lcsc.com/wmsc/upload/file/pdf/v2/lcsc/1912111437_Taiyo-Yuden-UMK212BBJ475KG-T_C412634.pdf; ComponentLink2Description: JLCPCB Part URL; ComponentLink2URL: https://jlcpcb.com/partdetail/C412634; ComponentLink3Description: LCSC Part URL; ComponentLink3URL: https://lcsc.com/product-detail/Multilayer-Ceramic-Capacitors-MLCC---SMD-SMT_Taiyo-Yuden-Taiyo-Yuden-UMK212BBJ475KG-T_C412634.html
footprint CAP-0805 (0805 (2012M) Capacitor)
pins: 1, 2

## UMK212BJ105KG-T
designator C?  Capacitance: 1uF  (hidden comment: *)
Capacitor, Ceramic (MLCC), 1uF, ±10%, 50V, X5R, ±10%, SMD 0805; Manufacturer: Taiyo Yuden; Manufacturer Part Number: UMK212BJ105KG-T; Package Size: 0805; JLCPCB Basic Part: No; JLCPCB Part Number: C319195; Supplier 1: LCSC; Category: Capacitors - MLCC; Supplier Part Number 1: C319195; Tolerance: ±10%; Voltage Rating: 50V; Temperature Coefficient: X5R; RoHS: Yes; ComponentLink1Description: Datasheet; ComponentLink1URL: https://wmsc.lcsc.com/wmsc/upload/file/pdf/v2/lcsc/2304140030_Taiyo-Yuden-UMK212BJ105KG-T_C319195.pdf; ComponentLink2Description: JLCPCB Part URL; ComponentLink2URL: https://jlcpcb.com/partdetail/C319195; ComponentLink3Description: LCSC Part URL; ComponentLink3URL: https://lcsc.com/product-detail/Multilayer-Ceramic-Capacitors-MLCC---SMD-SMT_Taiyo-Yuden-Taiyo-Yuden-UMK212BJ105KG-T_C319195.html
footprint CAP-0805 (0805 (2012M) Capacitor)
pins: 1, 2

## UMK212C7474KGHTE
designator C?  Capacitance: 470nF  (hidden comment: *)
Capacitor, Ceramic (MLCC), 470nF, ±10%, 50V, X7S, ±10%, SMD 0805; Manufacturer: Taiyo Yuden; Manufacturer Part Number: UMK212C7474KGHTE; Package Size: 0805; JLCPCB Basic Part: No; JLCPCB Part Number: C650958; Supplier 1: LCSC; Category: Capacitors - MLCC; Supplier Part Number 1: C650958; Tolerance: ±10%; Voltage Rating: 50V; Temperature Coefficient: X7S; RoHS: Yes; ComponentLink1Description: Datasheet; ComponentLink1URL: https://wmsc.lcsc.com/wmsc/upload/file/pdf/v2/lcsc/2304140030_Taiyo-Yuden-UMK212C7474KGHTE_C650958.pdf; ComponentLink2Description: JLCPCB Part URL; ComponentLink2URL: https://jlcpcb.com/partdetail/C650958; ComponentLink3Description: LCSC Part URL; ComponentLink3URL: https://lcsc.com/product-detail/Multilayer-Ceramic-Capacitors-MLCC---SMD-SMT_Taiyo-Yuden-Taiyo-Yuden-UMK212C7474KGHTE_C650958.html
footprint CAP-0805 (0805 (2012M) Capacitor)
pins: 1, 2

## V106K0805X5R160NHP
designator C?  Capacitance: 10uF  (hidden comment: *)
Capacitor, Ceramic (MLCC), 10uF, ±10%, 16V, X5R, ±10%, SMD 0805; Manufacturer: VIIYONG; Manufacturer Part Number: V106K0805X5R160NHP; Package Size: 0805; JLCPCB Basic Part: No; JLCPCB Part Number: C2980389; Supplier 1: LCSC; Category: Capacitors - MLCC; Supplier Part Number 1: C2980389; Tolerance: ±10%; Voltage Rating: 16V; Temperature Coefficient: X5R; RoHS: Yes; ComponentLink1Description: Datasheet; ComponentLink1URL: https://wmsc.lcsc.com/wmsc/upload/file/pdf/v2/lcsc/2203041530_VIIYONG-V106K0805X5R160NHP_C2980389.pdf; ComponentLink2Description: JLCPCB Part URL; ComponentLink2URL: https://jlcpcb.com/partdetail/C2980389; ComponentLink3Description: LCSC Part URL; ComponentLink3URL: https://lcsc.com/product-detail/Multilayer-Ceramic-Capacitors-MLCC---SMD-SMT_VIIYONG-VIIYONG-V106K0805X5R160NHP_C2980389.html
footprint CAP-0805 (0805 (2012M) Capacitor)
pins: 1, 2

## V226K0805X5R160NHP
designator C?  Capacitance: 22uF  (hidden comment: *)
Capacitor, Ceramic (MLCC), 22uF, 16V, X5R, SMD 0805; Manufacturer: VIIYONG; Manufacturer Part Number: V226K0805X5R160NHP; Package Size: 0805; JLCPCB Basic Part: No; JLCPCB Part Number: C4153835; Supplier 1: LCSC; Category: Capacitors - MLCC; Supplier Part Number 1: C4153835; Voltage Rating: 16V; Temperature Coefficient: X5R; RoHS: Yes; ComponentLink1Description: Datasheet; ComponentLink1URL: https://wmsc.lcsc.com/wmsc/upload/file/pdf/v2/lcsc/2207261800_VIIYONG-V226K0805X5R160NHP_C4153835.pdf; ComponentLink2Description: JLCPCB Part URL; ComponentLink2URL: https://jlcpcb.com/partdetail/C4153835; ComponentLink3Description: LCSC Part URL; ComponentLink3URL: https://lcsc.com/product-detail/Multilayer-Ceramic-Capacitors-MLCC---SMD-SMT_VIIYONG-VIIYONG-V226K0805X5R160NHP_C4153835.html
footprint CAP-0805 (0805 (2012M) Capacitor)
pins: 1, 2

## V226M0805X5R100NHP
designator C?  Capacitance: 22uF  (hidden comment: *)
Capacitor, Ceramic (MLCC), 22uF, 10V, X5R, SMD 0805; Manufacturer: VIIYONG; Manufacturer Part Number: V226M0805X5R100NHP; Package Size: 0805; JLCPCB Basic Part: No; JLCPCB Part Number: C4749141; Supplier 1: LCSC; Category: Capacitors - MLCC; Supplier Part Number 1: C4749141; Voltage Rating: 10V; Temperature Coefficient: X5R; RoHS: Yes; ComponentLink1Description: Datasheet; ComponentLink1URL: https://wmsc.lcsc.com/wmsc/upload/file/pdf/v2/lcsc/2207261800_VIIYONG-V226M0805X5R100NHP_C4749141.pdf; ComponentLink2Description: JLCPCB Part URL; ComponentLink2URL: https://jlcpcb.com/partdetail/C4749141; ComponentLink3Description: LCSC Part URL; ComponentLink3URL: https://lcsc.com/product-detail/Multilayer-Ceramic-Capacitors-MLCC---SMD-SMT_VIIYONG-VIIYONG-V226M0805X5R100NHP_C4749141.html
footprint CAP-0805 (0805 (2012M) Capacitor)
pins: 1, 2

## V226M0805X6S160NHP
designator C?  Capacitance: 22uF  (hidden comment: *)
Capacitor, Ceramic (MLCC), 22uF, ±20%, 16V, X6S, ±20%, SMD 0805; Manufacturer: VIIYONG; Manufacturer Part Number: V226M0805X6S160NHP; Package Size: 0805; JLCPCB Basic Part: No; JLCPCB Part Number: C3009908; Supplier 1: LCSC; Category: Capacitors - MLCC; Supplier Part Number 1: C3009908; Tolerance: ±20%; Voltage Rating: 16V; Temperature Coefficient: X6S; RoHS: Yes; ComponentLink1Description: Datasheet; ComponentLink1URL: https://wmsc.lcsc.com/wmsc/upload/file/pdf/v2/lcsc/2205171730_VIIYONG-V226M0805X6S160NHP_C3009908.pdf; ComponentLink2Description: JLCPCB Part URL; ComponentLink2URL: https://jlcpcb.com/partdetail/C3009908; ComponentLink3Description: LCSC Part URL; ComponentLink3URL: https://lcsc.com/product-detail/Multilayer-Ceramic-Capacitors-MLCC---SMD-SMT_VIIYONG-VIIYONG-V226M0805X6S160NHP_C3009908.html
footprint CAP-0805 (0805 (2012M) Capacitor)
pins: 1, 2

## VJ0805A100JXACW1BC
designator C?  Capacitance: 10pF  (hidden comment: *)
Capacitor, Ceramic (MLCC), 10pF, ±5%, 50V, C0G, ±5%, SMD 0805; Manufacturer: Vishay Intertech; Manufacturer Part Number: VJ0805A100JXACW1BC; Package Size: 0805; JLCPCB Basic Part: No; JLCPCB Part Number: C2174332; Supplier 1: LCSC; Category: Capacitors - MLCC; Supplier Part Number 1: C2174332; Tolerance: ±5%; Voltage Rating: 50V; Temperature Coefficient: C0G; RoHS: Yes; ComponentLink1Description: Datasheet; ComponentLink1URL: https://wmsc.lcsc.com/wmsc/upload/file/pdf/v2/lcsc/2304140030_Vishay-Intertech-VJ0805A100JXACW1BC_C2174332.pdf; ComponentLink2Description: JLCPCB Part URL; ComponentLink2URL: https://jlcpcb.com/partdetail/C2174332; ComponentLink3Description: LCSC Part URL; ComponentLink3URL: https://lcsc.com/product-detail/Multilayer-Ceramic-Capacitors-MLCC---SMD-SMT_Vishay-Intertech-Vishay-Intertech-VJ0805A100JXACW1BC_C2174332.html
footprint CAP-0805 (0805 (2012M) Capacitor)
pins: 1, 2

## VJ0805A101JXACW1BC
designator C?  Capacitance: 100pF  (hidden comment: *)
Capacitor, Ceramic (MLCC), 100pF, ±5%, 50V, C0G, ±5%, SMD 0805; Manufacturer: Vishay Intertech; Manufacturer Part Number: VJ0805A101JXACW1BC; Package Size: 0805; JLCPCB Basic Part: No; JLCPCB Part Number: C3000824; Supplier 1: LCSC; Category: Capacitors - MLCC; Supplier Part Number 1: C3000824; Tolerance: ±5%; Voltage Rating: 50V; Temperature Coefficient: C0G; RoHS: Yes; ComponentLink1Description: Datasheet; ComponentLink1URL: https://wmsc.lcsc.com/wmsc/upload/file/pdf/v2/lcsc/2204251600_Vishay-Intertech-VJ0805A101JXACW1BC_C3000824.pdf; ComponentLink2Description: JLCPCB Part URL; ComponentLink2URL: https://jlcpcb.com/partdetail/C3000824; ComponentLink3Description: LCSC Part URL; ComponentLink3URL: https://lcsc.com/product-detail/Multilayer-Ceramic-Capacitors-MLCC---SMD-SMT_Vishay-Intertech-Vishay-Intertech-VJ0805A101JXACW1BC_C3000824.html
footprint CAP-0805 (0805 (2012M) Capacitor)
pins: 1, 2

## VJ0805A181JXACW1BC
designator C?  Capacitance: 180pF  (hidden comment: *)
Capacitor, Ceramic (MLCC), 180pF, ±5%, 50V, C0G, ±5%, SMD 0805; Manufacturer: Vishay Intertech; Manufacturer Part Number: VJ0805A181JXACW1BC; Package Size: 0805; JLCPCB Basic Part: No; JLCPCB Part Number: C2211103; Supplier 1: LCSC; Category: Capacitors - MLCC; Supplier Part Number 1: C2211103; Tolerance: ±5%; Voltage Rating: 50V; Temperature Coefficient: C0G; RoHS: Yes; ComponentLink1Description: Datasheet; ComponentLink1URL: https://wmsc.lcsc.com/wmsc/upload/file/pdf/v2/lcsc/2304140030_Vishay-Intertech-VJ0805A181JXACW1BC_C2211103.pdf; ComponentLink2Description: JLCPCB Part URL; ComponentLink2URL: https://jlcpcb.com/partdetail/C2211103; ComponentLink3Description: LCSC Part URL; ComponentLink3URL: https://lcsc.com/product-detail/Multilayer-Ceramic-Capacitors-MLCC---SMD-SMT_Vishay-Intertech-Vishay-Intertech-VJ0805A181JXACW1BC_C2211103.html
footprint CAP-0805 (0805 (2012M) Capacitor)
pins: 1, 2

## VJ0805Y104KXATW1BC
designator C?  Capacitance: 100nF  (hidden comment: *)
Capacitor, Ceramic (MLCC), 100nF, ±10%, 50V, X7R, ±10%, SMD 0805; Manufacturer: Vishay Intertech; Manufacturer Part Number: VJ0805Y104KXATW1BC; Package Size: 0805; JLCPCB Basic Part: No; JLCPCB Part Number: C2169721; Supplier 1: LCSC; Category: Capacitors - MLCC; Supplier Part Number 1: C2169721; Tolerance: ±10%; Voltage Rating: 50V; Temperature Coefficient: X7R; RoHS: Yes; ComponentLink1Description: Datasheet; ComponentLink1URL: https://wmsc.lcsc.com/wmsc/upload/file/pdf/v2/lcsc/2304140030_Vishay-Intertech-VJ0805Y104KXATW1BC_C2169721.pdf; ComponentLink2Description: JLCPCB Part URL; ComponentLink2URL: https://jlcpcb.com/partdetail/C2169721; ComponentLink3Description: LCSC Part URL; ComponentLink3URL: https://lcsc.com/product-detail/Multilayer-Ceramic-Capacitors-MLCC---SMD-SMT_Vishay-Intertech-Vishay-Intertech-VJ0805Y104KXATW1BC_C2169721.html
footprint CAP-0805 (0805 (2012M) Capacitor)
pins: 1, 2

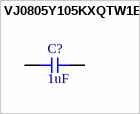
[diagram p82: symbol VJ0805Y105KXQTW1BC]

## VJ0805Y105KXQTW1BC
designator C?  Capacitance: 1uF  (hidden comment: *)
Capacitor, Ceramic (MLCC), 1uF, ±10%, 10V, X7R, ±10%, SMD 0805; Manufacturer: Vishay Intertech; Manufacturer Part Number: VJ0805Y105KXQTW1BC; Package Size: 0805; JLCPCB Basic Part: No; JLCPCB Part Number: C511417; Supplier 1: LCSC; Category: Capacitors - MLCC; Supplier Part Number 1: C511417; Tolerance: ±10%; Voltage Rating: 10V; Temperature Coefficient: X7R; RoHS: Yes; ComponentLink1Description: Datasheet; ComponentLink1URL: https://wmsc.lcsc.com/wmsc/upload/file/pdf/v2/lcsc/2005201835_Vishay-Intertech-VJ0805Y105KXQTW1BC_C511417.pdf; ComponentLink2Description: JLCPCB Part URL; ComponentLink2URL: https://jlcpcb.com/partdetail/C511417; ComponentLink3Description: LCSC Part URL; ComponentLink3URL: https://lcsc.com/product-detail/Multilayer-Ceramic-Capacitors-MLCC---SMD-SMT_Vishay-Intertech-Vishay-Intertech-VJ0805Y105KXQTW1BC_C511417.html
footprint CAP-0805 (0805 (2012M) Capacitor)
pins: 1, 2